# Altium footprint library mastermind.PCBLIB: 1061 footprints (part 42 of 67)
Each footprint in its own frame and in the unit in brackets; x right, y up, seen from the top. Pads: shape width x height; smd on the part's side, far side on the other; paste and mask are expansions set on the pad; w line width, h text height; cw(c..) or ccw(c..) is an arc to the next point about the centre after c.
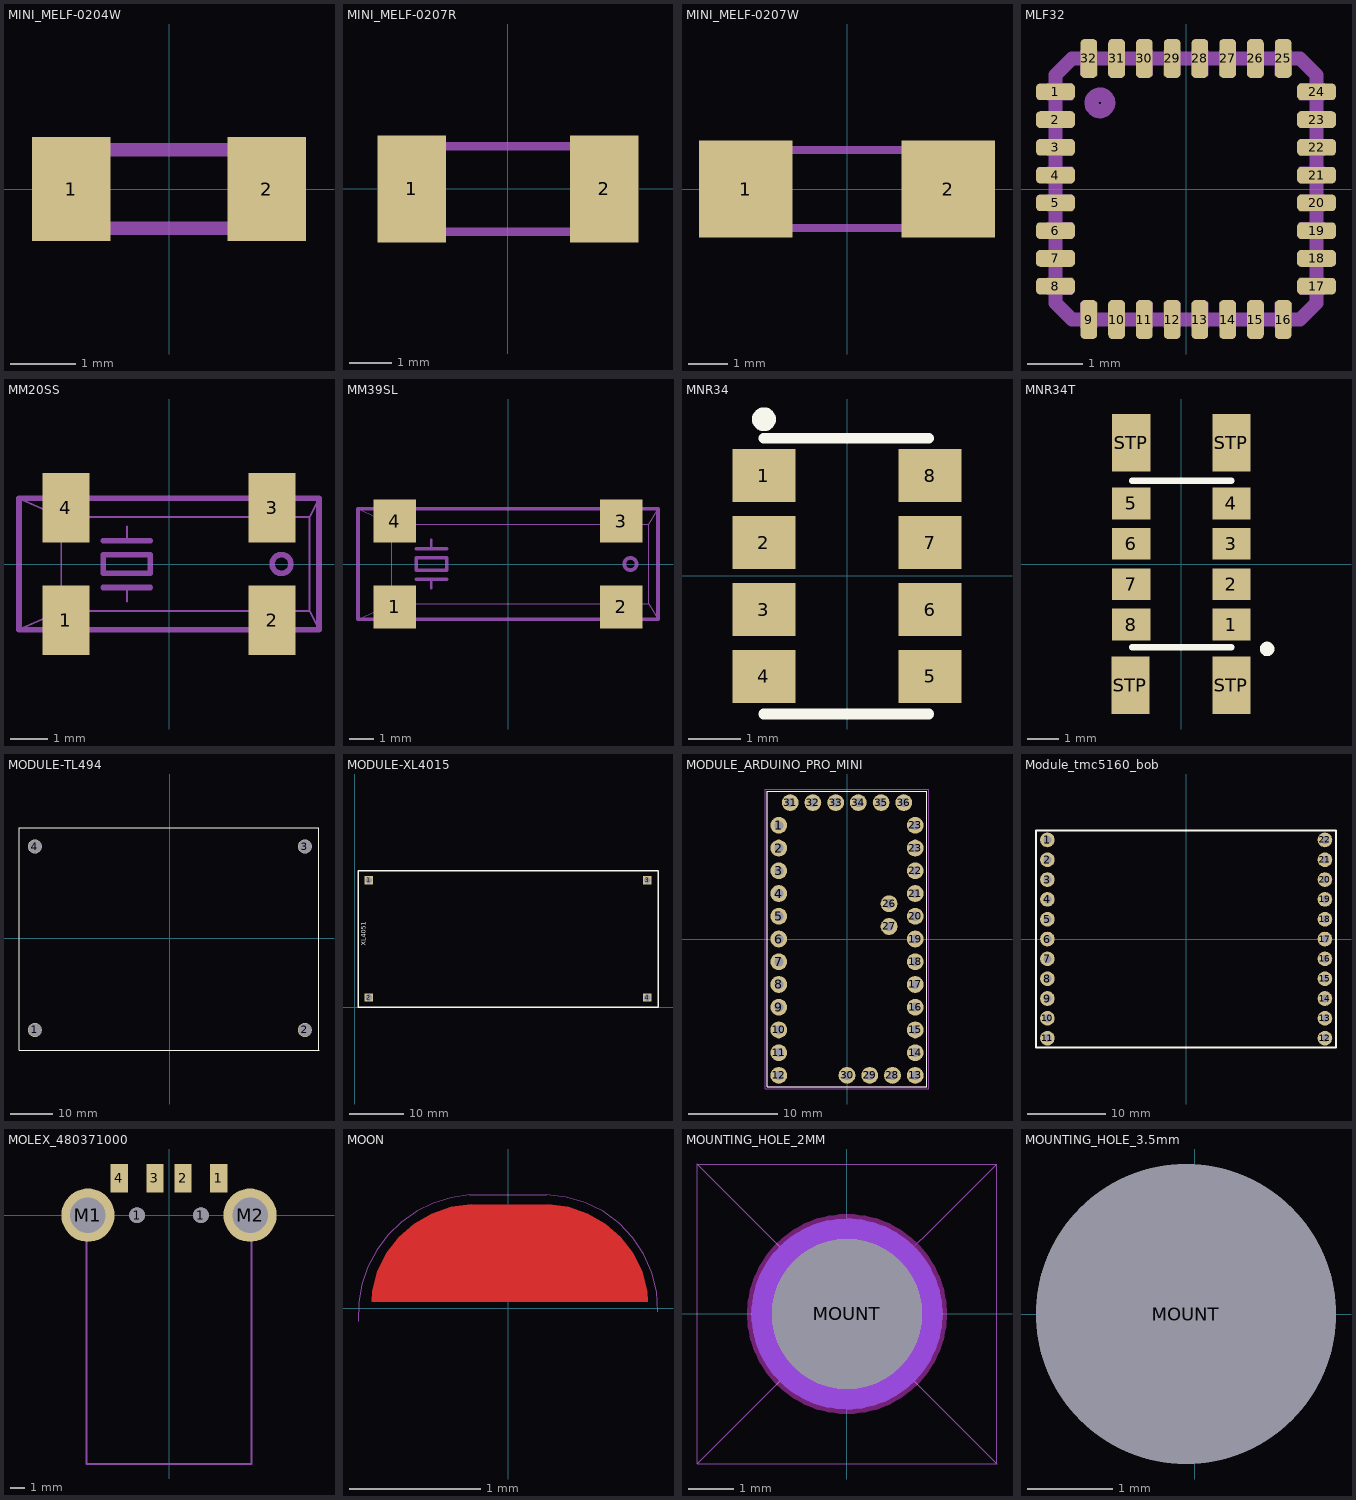
[diagram p41: the footprints below, top view; thin cyan lines are the x and y axes]

## MINI_MELF-0204W [mm]
pads (2):
  rect 1.2x1.6 smd: 1(-1.5,0) 2(1.5,0)
Mechanical 8:
  lines w0.203: -1.7,-0.6 -1.7,0.6 1.7,0.6 1.7,-0.6 -1.7,-0.6

## MINI_MELF-0207R [mm]
pads (2):
  rect 1.6x2.5 smd: 1(-2.25,0) 2(2.25,0)
Mechanical 8:
  lines w0.203: -2.8,-1 -2.8,1 2.8,1 2.8,-1 -2.8,-1

## MINI_MELF-0207W [mm]
pads (2):
  rect 2.4x2.5 smd: 1(-2.6,0) 2(2.6,0)
Mechanical 8:
  lines w0.203: -2.8,-1 -2.8,1 2.8,1 2.8,-1 -2.8,-1

## MLF32 [mm]
pads (32):
  rrect50% 0.7x0.3 smd: 1(-2.35,1.75) 2(-2.35,1.25) 3(-2.35,0.75) 4(-2.35,0.25) 5(-2.35,-0.25) 6(-2.35,-0.75) 7(-2.35,-1.25) 8(-2.35,-1.75) 17(2.35,-1.75) 18(2.35,-1.25) 19(2.35,-0.75) 20(2.35,-0.25) 21(2.35,0.25) 22(2.35,0.75) 23(2.35,1.25) 24(2.35,1.75)
  rrect50% 0.3x0.7 smd: 9(-1.75,-2.35) 10(-1.25,-2.35) 11(-0.75,-2.35) 12(-0.25,-2.35) 13(0.25,-2.35) 14(0.75,-2.35) 15(1.25,-2.35) 16(1.75,-2.35) 25(1.75,2.35) 26(1.25,2.35) 27(0.75,2.35) 28(0.25,2.35) 29(-0.25,2.35) 30(-0.75,2.35) 31(-1.25,2.35) 32(-1.75,2.35)
Mechanical 2:
  circle w0.254: c-1.55,1.55 r0.15
  lines w0.254: -2.35,-2.05 -2.05,-2.35 ; -2.35,2.05 -2.05,2.35 ; 2.05,-2.35 2.35,-2.05 ; 2.05,2.35 2.35,2.05
Mechanical 8:
  region: -1.9,2.05 -1.9,2.5 -1.6,2.5 -1.6,2.05
  region: -1.4,2.05 -1.4,2.5 -1.1,2.5 -1.1,2.05
  region: -0.9,2.05 -0.9,2.5 -0.6,2.5 -0.6,2.05
  region: -0.4,2.05 -0.4,2.5 -0.1,2.5 -0.1,2.05
  region: 0.1,2.05 0.1,2.5 0.4,2.5 0.4,2.05
  region: 0.6,2.05 0.6,2.5 0.9,2.5 0.9,2.05
  region: 1.1,2.05 1.1,2.5 1.4,2.5 1.4,2.05
  region: 1.6,2.05 1.6,2.5 1.9,2.5 1.9,2.05
  region: 2.05,1.6 2.05,1.9 2.5,1.9 2.5,1.6
  region: 2.05,1.1 2.05,1.4 2.5,1.4 2.5,1.1
  region: 2.05,0.6 2.05,0.9 2.5,0.9 2.5,0.6
  region: 2.05,0.1 2.05,0.4 2.5,0.4 2.5,0.1
  region: 2.05,-0.4 2.05,-0.1 2.5,-0.1 2.5,-0.4
  region: 2.05,-0.9 2.05,-0.6 2.5,-0.6 2.5,-0.9
  region: 2.05,-1.4 2.05,-1.1 2.5,-1.1 2.5,-1.4
  region: 2.05,-1.9 2.05,-1.6 2.5,-1.6 2.5,-1.9
  region: 1.6,-2.5 1.6,-2.05 1.9,-2.05 1.9,-2.5
  region: 1.1,-2.5 1.1,-2.05 1.4,-2.05 1.4,-2.5
  region: 0.6,-2.5 0.6,-2.05 0.9,-2.05 0.9,-2.5
  region: 0.1,-2.5 0.1,-2.05 0.4,-2.05 0.4,-2.5
  region: -0.4,-2.5 -0.4,-2.05 -0.1,-2.05 -0.1,-2.5
  region: -0.9,-2.5 -0.9,-2.05 -0.6,-2.05 -0.6,-2.5
  region: -1.4,-2.5 -1.4,-2.05 -1.1,-2.05 -1.1,-2.5
  region: -1.9,-2.5 -1.9,-2.05 -1.6,-2.05 -1.6,-2.5
  region: -2.5,-1.9 -2.5,-1.6 -2.05,-1.6 -2.05,-1.9
  region: -2.5,-1.4 -2.5,-1.1 -2.05,-1.1 -2.05,-1.4
  region: -2.5,-0.9 -2.5,-0.6 -2.05,-0.6 -2.05,-0.9
  region: -2.5,-0.4 -2.5,-0.1 -2.05,-0.1 -2.05,-0.4
  region: -2.5,0.1 -2.5,0.4 -2.05,0.4 -2.05,0.1
  region: -2.5,0.6 -2.5,0.9 -2.05,0.9 -2.05,0.6
  region: -2.5,1.1 -2.5,1.4 -2.05,1.4 -2.05,1.1
  region: -2.5,1.6 -2.5,1.9 -2.05,1.9 -2.05,1.6
  lines w0.254: -2.35,-2.05 -2.35,2.05 ; -2.05,-2.35 2.05,-2.35 ; -2.05,2.35 2.05,2.35 ; 2.35,-2.05 2.35,2.05

## MM20SS [mil]
pads (4):
  rect 50x74 smd: 1(-110,-60) 2(110,-60) 3(110,60) 4(-110,60)
Mechanical 2:
  circle w6: c120,0 r10
  lines w2: -160,-70 -140,-61.1 ; -160,70 -140,61.1 ; -115,-15 -115,15 ; -80,-50 80,-50 ; -80,50 80,50 ; -45,-40 -45,-25 ; -45,25 -45,40 ; 140,-50 150,-50 ; 140,50 150,50 ; 160,-70 150,-50 ; 160,70 150,50 ; 150,-50 150,50
  lines w6: -140,-70 -160,-70 -160,70 -140,70 ; -80,-70 80,-70 ; -80,70 80,70 ; -70,-25 -45,-25 -20,-25 ; -70,25 -45,25 -20,25 ; 140,-70 160,-70 160,70 140,70 ; -70,-10 -70,10 -20,10 -20,-10 -70,-10
Mechanical 8:
  lines w2: -140,-61.1 -115,-50 ; -140,61.1 -115,50 ; -115,-15 -115,-50 ; -115,15 -115,50 ; -80,-50 -115,-50 ; -80,50 -115,50 ; 80,-50 140,-50 ; 80,50 140,50
  lines w6: -140,-70 -80,-70 ; -140,70 -80,70 ; -120,-70 -120,-75 -100,-75 -100,-70 ; -120,70 -120,75 -100,75 -100,70 ; 80,-70 140,-70 ; 80,70 140,70 ; 100,-70 100,-75 120,-75 120,-70 ; 100,70 100,75 120,75 120,70

## MM39SL [mil]
pads (4):
  rect 70x70 smd: 1(-185,-70) 2(185,-70) 3(185,70) 4(-185,70)
Mechanical 2:
  circle w6: c200,0 r10
  lines w2: -245,-90 -225,-80.91 ; -245,90 -225,80.91 ; -190,-30 -190,30 ; -145,-65 145,-65 ; -145,65 145,65 ; 225,-65 230,-65 ; 225,65 230,65 ; 245,-90 230,-65 ; 245,90 230,65 ; 230,-65 230,65
  lines w4: -125,-40 -125,-25 ; -125,25 -125,40
  lines w6: -225,-90 -245,-90 -245,90 -225,90 ; -150,-25 -125,-25 -100,-25 ; -150,25 -125,25 -100,25 ; -145,-90 145,-90 ; -145,90 145,90 ; 225,-90 245,-90 245,90 225,90 ; -150,-10 -150,10 -100,10 -100,-10 -150,-10
Mechanical 8:
  lines w2: -225,-80.91 -190,-65 ; -225,80.91 -190,65 ; -190,-30 -190,-65 ; -190,30 -190,65 ; -145,-65 -190,-65 ; -145,65 -190,65 ; 145,-65 225,-65 ; 145,65 225,65
  lines w6: -225,-90 -145,-90 ; -225,90 -145,90 ; 145,-90 225,-90 ; 145,90 225,90

## MNR34 [mm]
pads (8):
  rect 1.2x1 smd: 1(-1.578,1.898) 2(-1.578,0.628) 3(-1.578,-0.642) 4(-1.578,-1.912) 5(1.572,-1.912) 6(1.572,-0.642) 7(1.572,0.628) 8(1.572,1.898)
Top Overlay:
  circle w0.254: c-1.578,2.965 r0.1
  lines w0.2: -1.578,-2.623 1.546,-2.623 ; -1.578,2.609 1.546,2.609
3D body: height 1.27, standoff 0, extent -2.032,-2.286 2.032,2.286

## MNR34T [mm]
pads (12):
  rect 1.2x1 smd: 1(1.575,-1.896) 2(1.575,-0.626) 3(1.575,0.644) 4(1.575,1.914) 5(-1.575,1.914) 6(-1.575,0.644) 7(-1.575,-0.626) 8(-1.575,-1.896)
  rect 1.2x1.8 smd: STP(-1.6,-3.801) STP(-1.575,3.819) STP(1.575,-3.801) STP(1.575,3.819)
Top Overlay:
  circle w0.254: c2.694,-2.658 r0.1
  lines w0.2: -1.549,-2.607 1.575,-2.607 ; -1.549,2.625 1.575,2.625
3D body: height 2, standoff 0, extent -1.649,-2.707 1.675,2.725

## MODULE-TL494 [mm]
pads (4):
  round 3.302 hole 3: 1(-31.5,-21.4) 2(31.5,-21.4) 3(31.5,21.4) 4(-31.5,21.4)
Top Overlay:
  lines w0.127: -35.21,-26.168 -35.21,25.832 34.79,25.832 34.79,-26.168 -35.21,-26.168
3D body "M3_F_TO_F_15MM_STANDOFF.STEP": height 15, standoff 0, extent 28.613,-23.9 34.387,-18.9
3D body "M3_F_TO_F_15MM_STANDOFF.STEP": height 15, standoff 0, extent 28.413,18.7 34.187,23.7
3D body "M3_F_TO_F_15MM_STANDOFF.STEP": height 15, standoff 0, extent -34.474,18.9 -28.7,23.9
3D body "M3_F_TO_F_15MM_STANDOFF.STEP": height 15, standoff 0, extent -34.374,-23.9 -28.6,-18.9

## MODULE-XL4015 [mil]
pads (4):
  rect 60x60 hole 47.24: 1(101,915) 2(100,70) 3(2109,917) 4(2110,70)
Top Overlay:
  lines w10: 23,0 23,984.25 2187,984.25 2187,0 23,0
  text "XL4051" at 95,445 h60
3D body "1x1 Male Pin Header.STEP": height 414.96, standoff -118.11, extent 50,20.79 150.2,119.22
3D body "1x1 Male Pin Header.STEP": height 414.96, standoff -118.11, extent 51,865.79 151.2,964.22
3D body "1x1 Male Pin Header.STEP": height 414.96, standoff -118.11, extent 2059,867.79 2159.2,966.22
3D body "1x1 Male Pin Header.STEP": height 414.96, standoff -118.11, extent 2060,20.79 2160.2,119.22
3D body "XL4015_MODELO_PISTAS.step": height 674.21, standoff 93.35, extent 42,19.58 2167.98,965

## MODULE_ARDUINO_PRO_MINI [mil]
pads (35):
  round 74 hole 40: 1(-300,500) 2(-300,400) 3(-300,300) 4(-300,200) 5(-300,100) 6(-300,0) 7(-300,-100) 8(-300,-200) 9(-300,-300) 10(-300,-400) 11(-300,-500) 12(-300,-600) 13(300,-600) 14(300,-500) 15(300,-400) 16(300,-300) 17(300,-200) 18(300,-100) 19(300,0) 20(300,100) 21(300,200) 22(300,300) 23(300,400) 23(300,500) 26(185,155) 27(185,55) 28(200,-600) 29(100,-600) 30(0,-600) 31(-250,600) 32(-150,600) 33(-50,600) 34(50,600) 35(150,600) 36(250,600)
Top Overlay:
  lines w5: -350,-650 350,-650 350,650 -350,650 -350,-650
Mechanical 13:
  lines w5: -350,-650 350,-650 350,650 -350,650 -350,-650
Mechanical 15:
  lines w1.97: -359.84,-659.84 -359.84,659.84 359.84,659.84 359.84,-659.84 -359.84,-659.84
3D body "Arduino Pro Mini R3 ATmega 328P.STEP": height 235.83, standoff -228.74, extent -366.14,-661.42 366.14,661.42

## Module_tmc5160_bob [mil]
pads (22):
  round 74 hole 40: 1(-700,500) 2(-700,400) 3(-700,300) 4(-700,200) 5(-700,100) 6(-700,0) 7(-700,-100) 8(-700,-200) 9(-700,-300) 10(-700,-400) 11(-700,-500) 12(700,-500) 13(700,-400) 14(700,-300) 15(700,-200) 16(700,-100) 17(700,0) 18(700,100) 19(700,200) 20(700,300) 21(700,400) 22(700,500)
Top Overlay:
  lines w10: -757.43,-547.64 -757.43,548.03 755.91,548.03 755.91,-547.64 -757.43,-547.64
3D body "TMC5160 Breakout Board V1.2.STEP": height 93.9, standoff -30.91, extent -751.97,-543.13 751.97,543.49

## MOLEX_480371000 [mm]
pads (8):
  round 1.1 hole 1.1: 1(-2.25,0) 1(2.25,0)
  rect 1.2x2 smd: 1(3.5,2.6) 2(1,2.6) 3(-1,2.6) 4(-3.5,2.6)
  round 3.75 hole 2.5: M1(-5.7,0) M2(5.7,0)
Mechanical 2:
  lines w0.127: -5.8,0 -5.8,-17.5 5.8,-17.5 5.8,0

## MOON [mm]
Top Layer:
  region: -1.041,0.051 1.067,0.051 1.062,0.128 1.022,0.279 0.953,0.418 0.859,0.541 0.742,0.644 0.607,0.722 0.46,0.772 0.306,0.792 0.229,0.787 -0.203,0.787 -0.281,0.792 -0.435,0.772 -0.582,0.722 -0.716,0.644 -0.833,0.541 -0.928,0.418 -0.996,0.279 -1.036,0.128
Mechanical 2:
  lines w0: -1.143,-0.102 cw(c-0.235,-0.044) -0.292,0.864 0.292,0.864 cw(c0.273,-0.007) 1.143,-0.025

## MOUNTING_HOLE_2MM [mm]
pads (1):
  round 3.3 hole 3.3 unplated paste-2539.97 mask+0: MOUNT(0,0)
Top Layer keep-out:
  circle w0.6: c0,0 r1.8
Bottom Layer keep-out:
  circle w0.6: c0,0 r1.8
Keep-Out Layer:
  circle w0.6: c0,0 r1.9
Mechanical 2:
  lines w0.025: -3.3,-3.3 0,0 ; -3.3,-3.3 3.3,-3.3 ; -3.3,-3.3 -3.3,3.3 ; -3.3,3.3 3.3,3.3 ; -3.3,3.3 0,0 ; 0,0 3.3,-3.3 ; 0,0 3.3,3.3 ; 3.3,-3.3 3.3,3.3
Mechanical 6:
  circle w0.1: c0,0 r1.325
  lines w0.1: -0.5,0 0.5,0 ; 0,-0.5 0,0.5
Dimensions:
  circle w0.4: c0,0 r1.7
  region: -0.3,-0.8 -0.9,-0.8 -0.9,-1.6 -0.3,-1.6
  region: 0.8,-0.3 0.3,-0.8 0.966,-1.466 1.466,-0.966
  rectangle: 0.3,-1.6 0.9,-0.8
  region: 0.8,-0.3 0.8,-0.9 1.6,-0.9 1.6,-0.3
  region: -0.3,-0.8 -0.8,-0.3 -1.466,-0.966 -0.966,-1.466
  region: -1.6,-0.3 -1.6,-0.9 -0.8,-0.9 -0.8,-0.3
  region: -0.8,0.3 -0.3,0.8 -0.966,1.466 -1.466,0.966
  region: -0.3,1.6 -0.9,1.6 -0.9,0.8 -0.3,0.8
  region: -0.8,0.3 -0.8,0.9 -1.6,0.9 -1.6,0.3
  region: 0.3,0.8 0.8,0.3 1.466,0.966 0.966,1.466
  region: 1.6,0.3 1.6,0.9 0.8,0.9 0.8,0.3
  rectangle: 0.3,0.8 0.9,1.6
Mechanical 8:
  circle w0.6: c0,0 r1.8

## MOUNTING_HOLE_3.5mm [mm]
pads (1):
  round 3.5 hole 3.5 unplated paste-2539.97 mask+0: MOUNT(-0.1,0)